# Altium footprint library Lib.PcbLib: 177 footprints (part 2 of 12)
Each footprint in its own frame and in the unit in brackets; x right, y up, seen from the top. Pads: shape width x height; smd on the part's side, far side on the other; paste and mask are expansions set on the pad; w line width, h text height; cw(c..) or ccw(c..) is an arc to the next point about the centre after c.
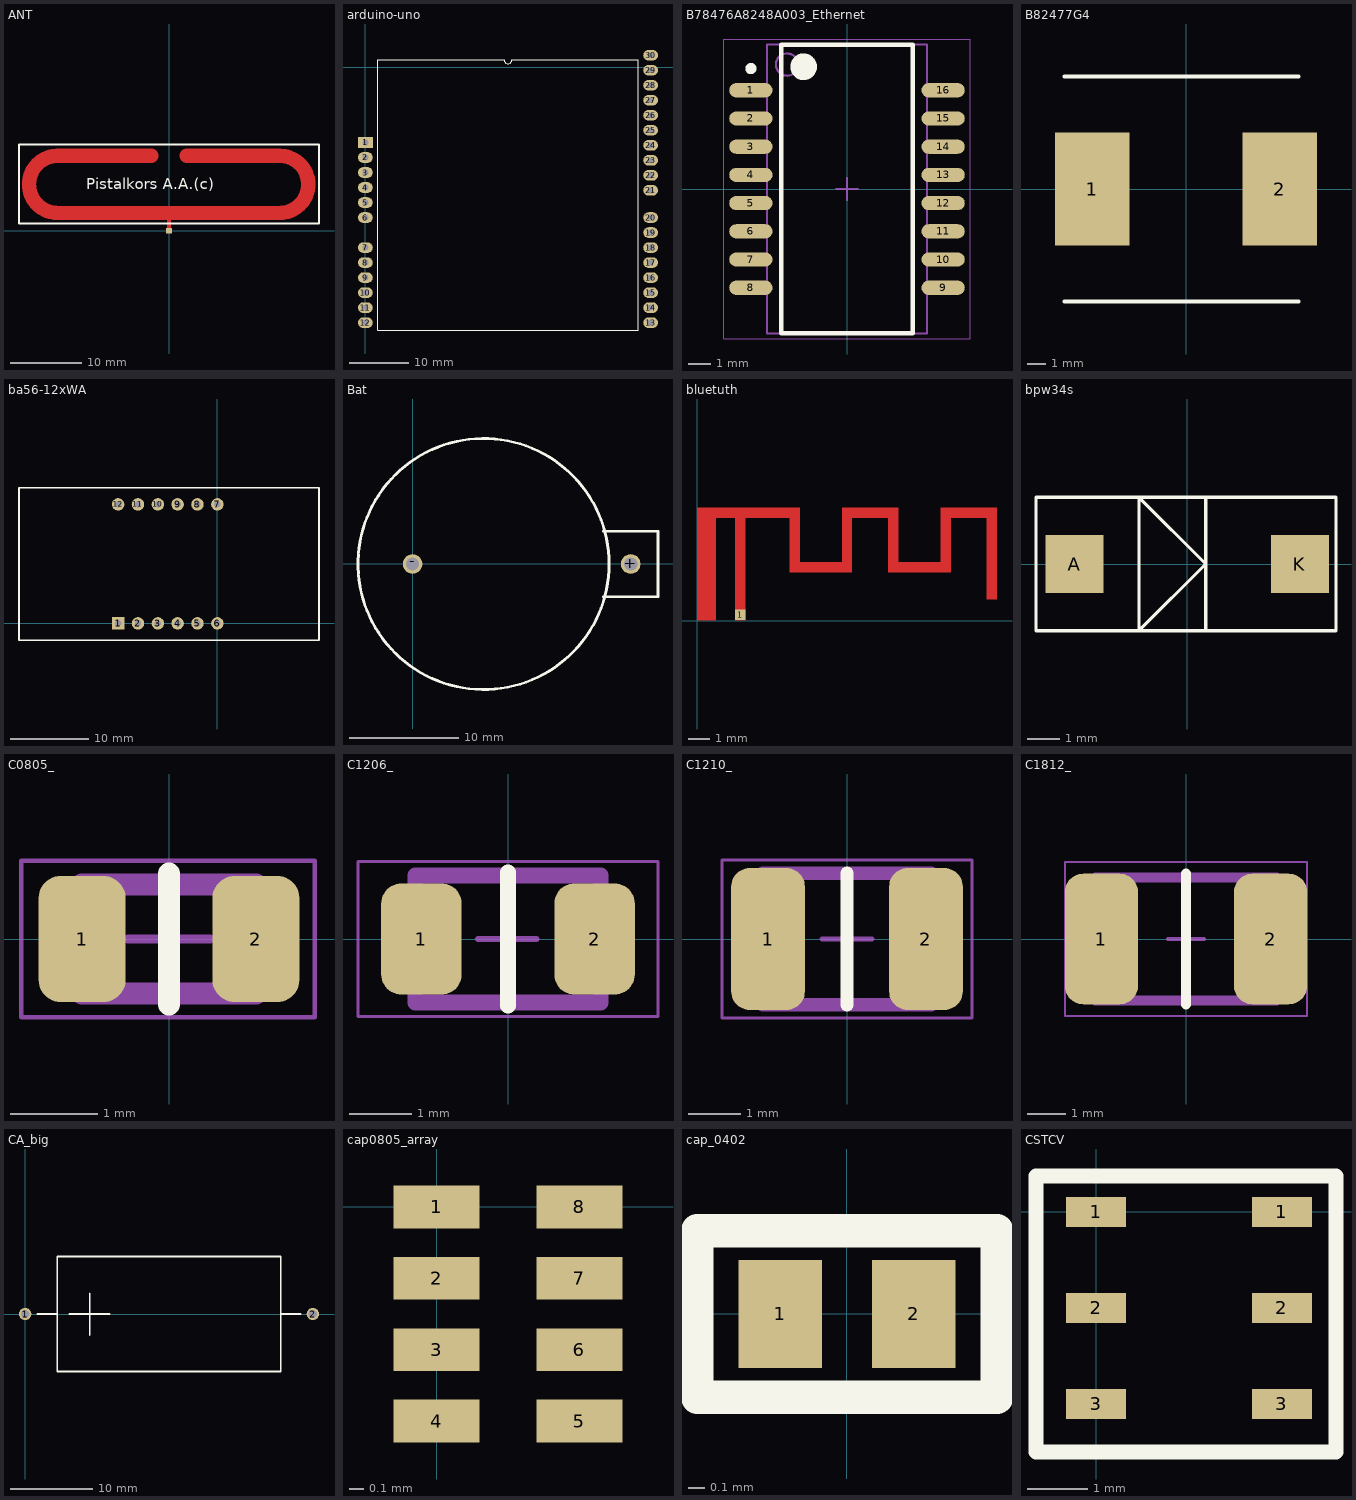
[diagram p1: the footprints below, top view; thin cyan lines are the x and y axes]

## ANT [mm]
pads (1):
  rect 0.8x0.8 smd: 1(0,0)
Top Layer:
  lines w0.6: 0,0 0,2.5
  lines w2: -15.6,2.5 cw(c-15.6,6.5) -15.6,10.5 ; -15.5,2.5 15.5,2.5 ccw(c15.5,6.5) 15.5,10.5 2.5,10.5 ; -15.5,10.5 -2.5,10.5
Top Overlay:
  lines w0.254: -21,1 21,1 21,12.1 -21,12.1 -21,1
  text "Pistalkors A.A.(c)" at -11.6,5.8 h1.52

## arduino-uno [mm]
pads (30):
  rect 2.5x1.8 hole 1: 1(0,-12.7)
  oval 2.5x1.8 hole 1: 2(0,-15.24) 3(0,-17.78) 4(0,-20.32) 5(0,-22.86) 6(0,-25.4) 7(0,-30.48) 8(0,-33.02) 9(0,-35.56) 10(0,-38.1) 11(0,-40.64) 12(0,-43.18) 13(48.26,-43.18) 14(48.26,-40.64) 15(48.26,-38.1) 16(48.26,-35.56) 17(48.26,-33.02) 18(48.26,-30.48) 19(48.26,-27.94) 20(48.26,-25.4) 21(48.26,-20.8) 22(48.26,-18.26) 23(48.26,-15.72) 24(48.26,-13.18) 25(48.26,-10.64) 26(48.26,-8.1) 27(48.26,-5.56) 28(48.26,-3.02) 29(48.26,-0.48) 30(48.26,2.06)
Top Overlay:
  lines w0.2: 2.085,-44.45 2.085,1.27 23.495,1.27 ccw(c24.13,1.27) 24.765,1.27 46.175,1.27 46.175,-44.45 2.085,-44.45
3D body "PCB2.step": height -3.5, standoff -15.2, extent -15,-48.225 65,12.05

## B78476A8248A003_Ethernet [mm] "B78476A8248A003"
height 5.85
pads (16):
  oval 1.95x0.64 smd: 1(-4.325,4.445) 2(-4.325,3.175) 3(-4.325,1.905) 4(-4.325,0.635) 5(-4.325,-0.635) 6(-4.325,-1.905) 7(-4.325,-3.175) 8(-4.325,-4.445) 9(4.325,-4.445) 10(4.325,-3.175) 11(4.325,-1.905) 12(4.325,-0.635) 13(4.325,0.635) 14(4.325,1.905) 15(4.325,3.175) 16(4.325,4.445)
Top Overlay:
  circle w0.6: c-1.95,5.5 r0.3
  circle w0.25: c-4.325,5.42 r0.125
  lines w0.2: -2.95,-6.5 2.95,-6.5 2.95,6.5 -2.95,6.5 -2.95,-6.5
Mechanical 13:
  circle w0.1: c-2.7,5.6 r0.5
  lines w0.1: -3.6,-6.5 3.6,-6.5 3.6,6.5 -3.6,6.5 -3.6,-6.5
Mechanical 15:
  lines w0.05: -5.55,-6.75 5.55,-6.75 5.55,6.75 -5.55,6.75 -5.55,-6.75
  lines w0.1: -0.5,0 0.5,0 ; 0,-0.5 0,0.5
3D body: height 5.85, standoff 0.25, extent -3.6,-6.5 3.6,6.5

## B82477G4 [mm]
pads (2):
  rect 4x6 smd: 1(-5,0) 2(5,0)
Top Overlay:
  lines w0.2: -6.5,-6 6,-6 ; -6.5,6 6,6
3D body "User Library-b82477g4.STEP": height 8, standoff 0, extent -6.4,-6.3 6.4,6.5

## ba56-12xWA [mm]
pads (12):
  rect 1.6x1.6 hole 0.8: 1(-12.7,0)
  round 1.6 hole 0.8: 2(-10.16,0) 3(-7.62,0) 4(-5.08,0) 5(-2.54,0) 6(0,0) 7(0,15.24) 8(-2.54,15.24) 9(-5.08,15.24) 10(-7.62,15.24) 11(-10.16,15.24) 12(-12.7,15.24)
Top Overlay:
  lines w0.2: -25.4,-2.175 -25.4,17.375 13.025,17.375 13.025,-2.175 -25.4,-2.175
3D body "end-el-san Co Ltd-King Bright BX56-12A.step": height 8.3, standoff -3.8, extent -24.975,-1.9 12.625,17.1

## Bat [mm]
pads (2):
  round 1.8 hole 1.2: +(20,0) -(0,0)
Top Overlay:
  circle w0.254: c6.5,0 r11.511
  lines w0.254: 17.5,-3 22.5,-3 22.5,3 17.5,3

## bluetuth [mm]
pads (1):
  rect 0.5x0.5 smd: 1(2.05,0.275)
Top Layer:
  rectangle: 0,0 0.9,4.9
  rectangle: 0,4.9 4.9,5.4
  rectangle: 1.8,0 2.3,5.2
  rectangle: 4.4,2.3 4.9,4.9
  rectangle: 4.9,2.3 6.9,2.8
  rectangle: 6.9,2.3 7.4,4.9
  rectangle: 6.9,4.9 9.6,5.4
  rectangle: 9.1,2.3 9.6,4.9
  rectangle: 9.6,2.3 11.6,2.8
  rectangle: 11.6,2.3 12.1,4.9
  rectangle: 11.6,4.9 14.3,5.4
  rectangle: 13.8,1 14.3,4.9

## bpw34s [mm]
pads (2):
  rect 1.8x1.8 smd: A(-3.5,0) K(3.5,0)
Top Overlay:
  lines w0.1: 0.575,-2.075 0.575,2.075 ; -4.7,-2.075 -4.7,-1.5 -4.7,2.075 4.625,2.075 4.625,-2.075 -4.7,-2.075 ; -1.5,-2.075 -1.5,2.075 0.575,0 -1.5,-2.075
3D body: height 0.25, standoff 0, extent 0,0 0,0
3D body "User Library-bpw34s.STEP": height 1.22, standoff 0, extent -3.203,-1.95 3.204,1.95

## C0805_ [mm]
height 0.025
pads (2):
  rrect50% 1x1.45 smd: 1(-1,0) 2(1,0)
Top Overlay:
  lines w0.254: 0,-0.75 0,0.75
Mechanical 3:
  lines w0.254: -1,-0.625 1,-0.625 1,0.625 -1,0.625 -1,-0.625
Mechanical 13:
  lines w0.1: -1,-0.625 -1,0.625 1,0.625 1,-0.625 -1,-0.625
Mechanical 15:
  lines w0.05: -1.7,-0.9 1.675,-0.9 1.675,0.9 -1.7,0.9 -1.7,-0.9
  lines w0.1: -0.475,0 0.475,0 ; 0,-0.475 0,0.475
3D body "SW3dPS-0805 SMD Capacitor.STEP": height 0.78, standoff 0, extent -1,-0.625 1,0.625

## C1206_ [mm]
height 2
pads (2):
  rrect50% 1.3x1.8 smd: 1(-1.4,0) 2(1.4,0)
Top Overlay:
  lines w0.254: 0,-1.075 0,1.075
Mechanical 3:
  lines w0.254: -1.5,-1.025 1.5,-1.025 1.5,1.025 -1.5,1.025 -1.5,-1.025
Mechanical 13:
  lines w0.1: -1.525,-1.025 1.5,-1.025 1.5,1.025 -1.525,1.025 -1.525,-1.025
Mechanical 15:
  lines w0.05: -2.425,-1.25 2.425,-1.25 2.425,1.25 -2.425,1.25 -2.425,-1.25
  lines w0.1: -0.488,0 0.462,0 ; -0.013,-0.475 -0.013,0.475
3D body "SW3dPS-1206 SMD Capacitor.STEP": height 1, standoff 0, extent -1.6,-0.8 1.6,0.8

## C1210_ [mm]
pads (2):
  rrect50% 1.4x2.7 smd: 1(-1.5,0) 2(1.5,0)
Top Overlay:
  lines w0.254: 0,-1.25 0,1.25
Mechanical 3:
  lines w0.254: -1.6,-1.25 1.6,-1.25 1.6,1.25 -1.6,1.25 -1.6,-1.25
Mechanical 13:
  lines w0.1: -1.6,-1.25 -1.6,1.25 1.6,1.25 1.6,-1.25 -1.6,-1.25
Mechanical 15:
  lines w0.05: -2.375,-1.5 2.375,-1.5 2.375,1.5 -2.375,1.5 -2.375,-1.5
  lines w0.1: -0.475,0 0.475,0 ; 0,-0.475 0,0.475
3D body "c1210c105k1ractu.stp": height 1.94, standoff 0.04, extent -1.651,-1.35 1.749,1.35

## C1812_ [mm]
pads (2):
  rrect50% 1.9x3.4 smd: 1(-2.2,0) 2(2.2,0)
Top Overlay:
  lines w0.254: 0,-1.7 0,1.7
Mechanical 3:
  lines w0.254: -2.35,-1.6 -2.35,1.6 2.35,1.6 2.35,-1.6 -2.35,-1.6
Mechanical 13:
  lines w0.1: -2.35,-1.6 -2.35,1.6 2.35,1.6 2.35,-1.6 -2.35,-1.6
Mechanical 15:
  lines w0.05: -3.15,-2 3.15,-2 3.15,2 -3.15,2 -3.15,-2
  lines w0.1: -0.475,0 0.475,0 ; 0,-0.475 0,0.475
3D body "70611065.stp": height 1.84, standoff 0.04, extent -2.45,-1.778 2.45,1.722

## CA_big [mm]
pads (2):
  round 1.5 hole 1: 1(0,0) 2(35,0)
Top Overlay:
  lines w0.2: 1.5,0 3.925,0 ; 5.4,0 10.3,0 ; 7.87,-2.6 7.87,2.5 ; 31.075,0 33.5,0 ; 3.925,0 3.925,-7 31.075,-7 31.075,7 3.925,7 3.925,0

## cap0805_array [mm]
pads (8):
  rect 0.6x0.3 smd: 1(0,0) 2(0,-0.5) 3(0,-1) 4(0,-1.5) 5(1,-1.5) 6(1,-1) 7(1,-0.5) 8(1,0)
3D body "User Library-lla215.step": height 0.52, standoff 0, extent -0.14,-1.75 1.14,0.25

## cap_0402 [mm]
pads (2):
  rect 0.5x0.65 smd: 1(-0.4,0) 2(0.4,0)
Top Overlay:
  lines w0.2: -0.9,-0.5 -0.9,0.2 -0.9,0.5 0.9,0.5 0.9,-0.5 -0.9,-0.5
3D body "User Library-0402 SMD Capacitor.step": height 0.2, standoff 0, extent -0.5,-0.3 0.5,0.3

## CSTCV [mm]
pads (6):
  rect 1x0.5 smd: 1(0,0) 1(3.1,0) 2(0,-1.6) 2(3.1,-1.6) 3(0,-3.2) 3(3.1,-3.2)
Top Overlay:
  lines w0.254: -1,-4 4,-4 4,0.6 -1,0.6 -1,-4
3D body "User Library-CSTCV16MQX11Q04-R0.step": height 1.3, standoff 0, extent 0.05,-3.45 3.15,0.25